# Altium footprint library IS12.01.02.PcbLib: 38 footprints (part 2 of 3)
Each footprint in its own frame and in the unit in brackets; x right, y up, seen from the top. Pads: shape width x height; smd on the part's side, far side on the other; paste and mask are expansions set on the pad; w line width, h text height; cw(c..) or ccw(c..) is an arc to the next point about the centre after c.
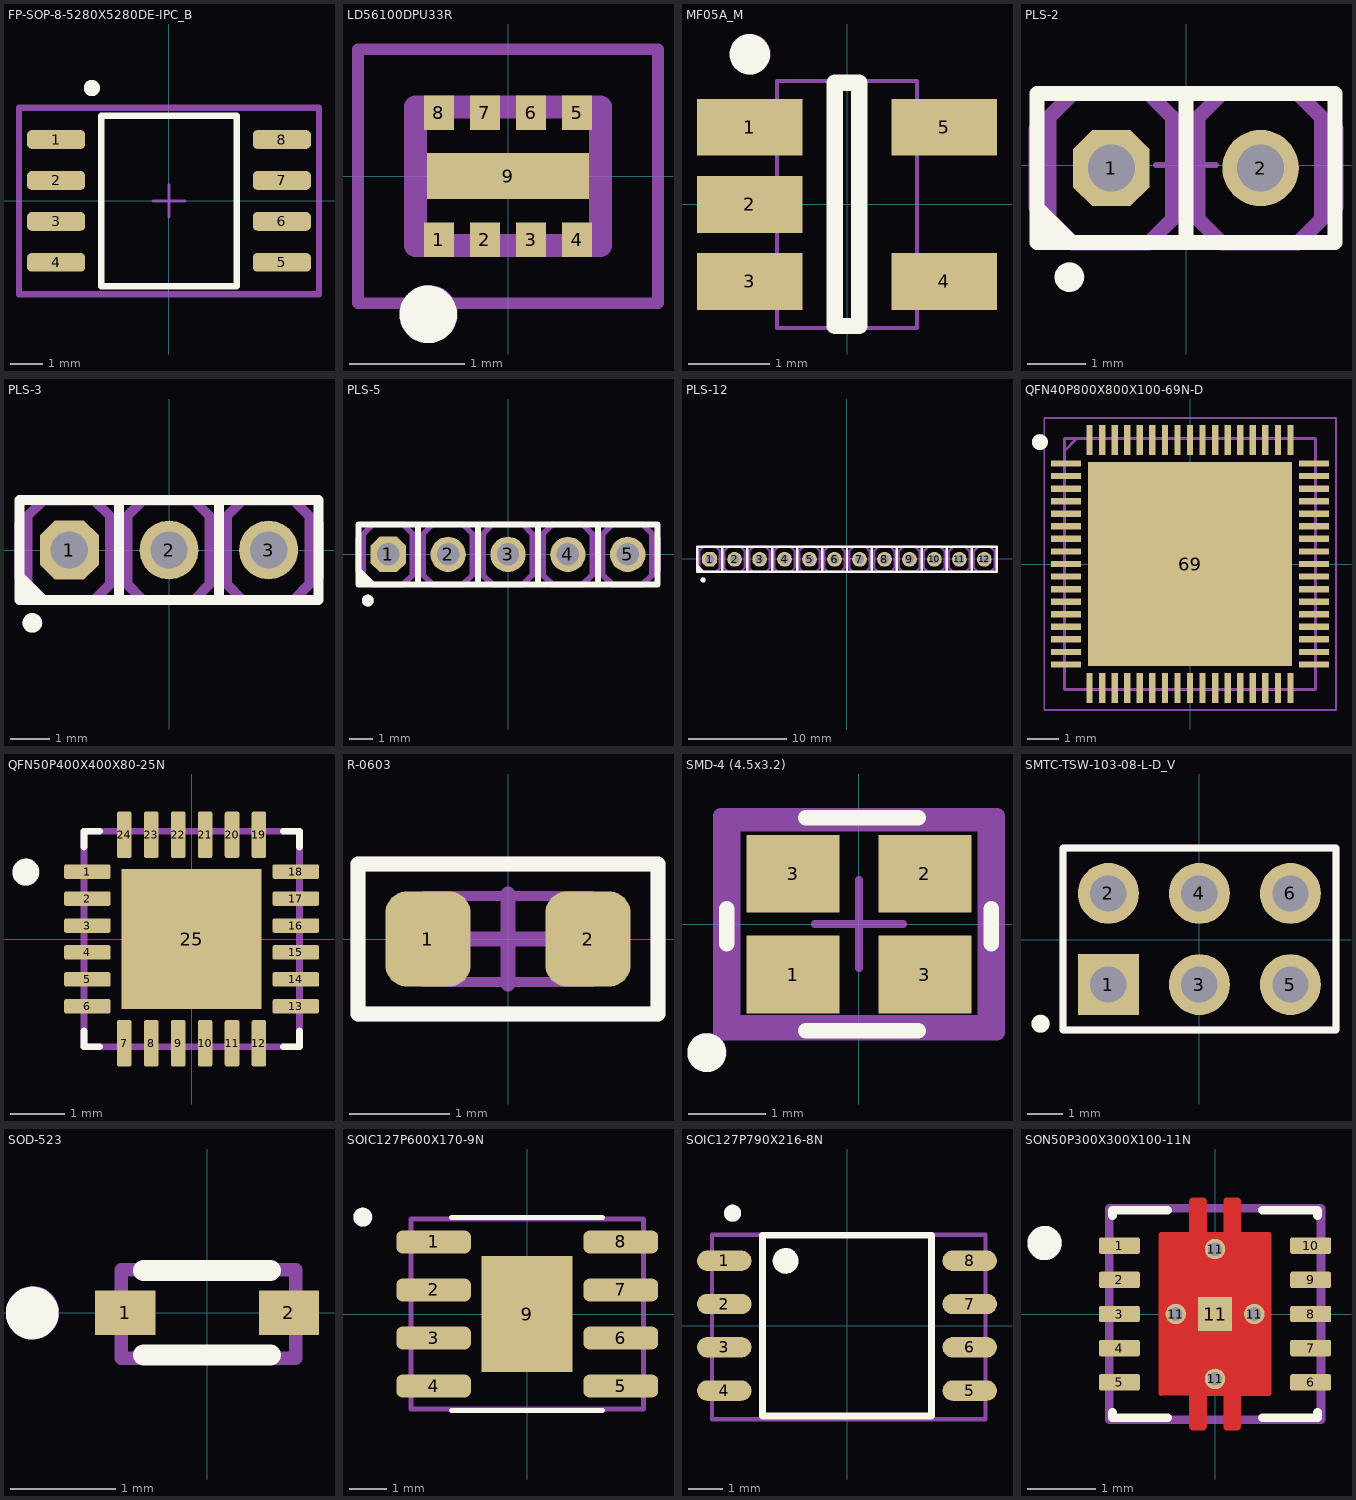
[diagram p1: the footprints below, top view; thin cyan lines are the x and y axes]

## FP-SOP-8-5280X5280DE-IPC_B [mm]
pads (8):
  rrect50% 1.805x0.582 smd paste+0 mask+0.051: 1(-3.501,1.905) 2(-3.501,0.635) 3(-3.501,-0.635) 4(-3.501,-1.905) 5(3.501,-1.905) 6(3.501,-0.635) 7(3.501,0.635) 8(3.501,1.905)
Top Overlay:
  circle w0.25: c-2.394,3.501 r0.125
  lines w0.2: -2.098,-2.64 -2.098,2.64 2.098,2.64 2.098,-2.64 -2.098,-2.64
Top Assembly:
  circle w0.25: c-2.388,3.505 r0.125
  lines w0.2: -4.653,-2.89 -4.653,2.89 4.653,2.89 4.653,-2.89 -4.653,-2.89
Top Courtyard:
  lines w0.2: -4.653,-2.89 -4.653,2.89 4.653,2.89 4.653,-2.89 -4.653,-2.89
Top Component Center:
  lines w0.1: -0.5,0 0.5,0 ; 0,-0.5 0,0.5
3D body "IC_ISSI_IS25LP064A-JBLE_eec.STEP": height 0.25, standoff 0, extent -4.653,-2.89 4.653,2.89

## LD56100DPU33R [mm]
pads (9):
  rect 0.26x0.3 smd: 1(-0.6,-0.55) 2(-0.2,-0.55) 3(0.2,-0.55) 4(0.6,-0.55) 5(0.6,0.55) 6(0.2,0.55) 7(-0.2,0.55) 8(-0.6,0.55)
  rect 1.4x0.4 smd: 9(0,0)
Top Overlay:
  circle w0.25: c-0.692,-1.198 r0.125
Top Assembly:
  circle w0.25: c-0.686,-1.194 r0.125
  lines w0.2: -0.8,-0.6 -0.8,0.6 0.8,0.6 0.8,-0.6 -0.8,-0.6
Mechanical 20:
  lines w0.1: -1.3,-1.1 1.3,-1.1 1.3,1.1 -1.3,1.1 -1.3,-1.1
3D body "LD56100DPU33R.stp": height 1.1, standoff 0, extent -0.8,-0.6 0.8,0.6

## MF05A_M [mm]
pads (5):
  rect 1.3x0.7 smd: 1(-1.2,0.95) 2(-1.2,0) 3(-1.2,-0.95) 4(1.2,-0.95) 5(1.2,0.95)
Top Overlay:
  circle w0.25: c-1.2,1.85 r0.125
  lines w0.2: -0.15,-1.5 -0.15,1.5 0.15,1.5 0.15,-1.5 -0.15,-1.5
Top Assembly:
  circle w0.25: c-1.194,1.854 r0.125
  lines w0.05: -0.864,-1.524 -0.864,1.524 0.864,1.524 0.864,-1.524 -0.864,-1.524
3D body: height 1.19, standoff 0.05, extent -0.835,-1.495 0.835,1.495

## PLS-2 [mm]
pads (2):
  oct 1.3x1.3 hole 0.8: 1(-1.27,-0.051)
  round 1.3 hole 0.8: 2(1.27,-0.051)
Top Overlay:
  circle w0.25: c-1.987,-1.909 r0.125
  region: -2.54,-0.551 -1.77,-1.321 -2.54,-1.321
  lines w0.254: 0,-1.301 0,1.199 ; 2.54,-1.321 -2.54,-1.321 -2.54,1.219 2.54,1.219 ; 2.54,-1.301 2.54,1.199
Top Assembly:
  circle w0.25: c-1.981,-1.905 r0.125
  lines w0.254: -2.334,-0.724 -2.554,-0.724 -2.554,0.616 -2.334,0.616 ; -0.234,-0.724 0.206,-0.724 ; -0.234,0.616 0.206,0.616 ; 2.334,-0.717 2.554,-0.717 2.554,0.623 2.334,0.623 ; -1.604,-0.374 -0.964,-0.374 ; -1.604,-0.374 -1.604,0.266 ; -1.604,-0.374 -1.404,-0.174 ; -1.604,0.266 -0.964,0.266 ; -1.604,0.266 -1.404,0.066 ; -1.404,-0.174 -1.164,-0.174 ; -1.404,-0.174 -1.404,0.066 ; -1.404,0.066 -1.164,0.066 ; -1.164,-0.174 -0.964,-0.374 ; -1.164,-0.174 -1.164,0.066 ; -1.164,0.066 -0.964,0.266 ; -0.964,-0.374 -0.964,0.266 ; 0.936,-0.374 0.936,0.266 ; 0.936,-0.374 1.136,-0.174 ; 0.936,-0.374 1.576,-0.374 ; 0.936,0.266 1.136,0.066 ; 0.936,0.266 1.576,0.266 ; 1.136,-0.174 1.376,-0.174 ; 1.136,-0.174 1.136,0.066 ; 1.136,0.066 1.376,0.066 ; 1.376,-0.174 1.576,-0.374 ; 1.376,-0.174 1.376,0.066 ; 1.376,0.066 1.576,0.266 ; 1.576,-0.374 1.576,0.266 ; -2.334,-0.924 -2.334,0.816 -1.934,1.216 -0.634,1.216 -0.234,0.816 -0.234,-0.924 -0.634,-1.324 -1.934,-1.324 -2.334,-0.924 ; 0.206,-0.924 0.206,0.816 0.606,1.216 1.906,1.216 2.306,0.816 2.306,-0.924 1.906,-1.324 0.606,-1.324 0.206,-0.924
Top Component Center:
  lines w0.1: -0.508,0 0.508,0 ; 0,-0.508 0,0.508
3D body "PLS-2.step": height 8.65, standoff -2.95, extent -2.54,-1.346 2.54,1.194

## PLS-3 [mm]
pads (3):
  oct 1.5x1.5 hole 0.95: 1(-2.54,0)
  round 1.5 hole 0.95: 2(0,0) 3(2.54,0)
Top Overlay:
  circle w0.25: c-3.486,-1.858 r0.125
  region: -3.81,-0.5 -3.04,-1.27 -3.81,-1.27
  lines w0.254: -1.27,-1.25 -1.27,1.25 ; 1.27,-1.25 1.27,1.25 ; 3.81,-1.27 -3.81,-1.27 -3.81,1.27 3.81,1.27 ; 3.81,-1.25 3.81,1.25
Top Assembly:
  circle w0.25: c-3.48,-1.854 r0.125
  lines w0.254: -3.604,-0.674 -3.824,-0.674 -3.824,0.666 -3.604,0.666 ; -1.504,-0.674 -1.064,-0.674 ; -1.504,0.666 -1.064,0.666 ; 1.036,-0.674 1.476,-0.674 ; 1.036,0.666 1.476,0.666 ; 3.604,-0.666 3.824,-0.666 3.824,0.674 3.604,0.674 ; -2.874,-0.324 -2.674,-0.124 ; -2.874,-0.324 -2.874,0.316 ; -2.874,-0.324 -2.234,-0.324 ; -2.874,0.316 -2.674,0.116 ; -2.874,0.316 -2.234,0.316 ; -2.674,-0.124 -2.674,0.116 ; -2.674,-0.124 -2.434,-0.124 ; -2.674,0.116 -2.434,0.116 ; -2.434,-0.124 -2.434,0.116 ; -2.434,-0.124 -2.234,-0.324 ; -2.434,0.116 -2.234,0.316 ; -2.234,-0.324 -2.234,0.316 ; -0.334,-0.324 0.306,-0.324 ; -0.334,-0.324 -0.134,-0.124 ; -0.334,-0.324 -0.334,0.316 ; -0.334,0.316 0.306,0.316 ; -0.334,0.316 -0.134,0.116 ; -0.134,-0.124 -0.134,0.116 ; -0.134,-0.124 0.106,-0.124 ; -0.134,0.116 0.106,0.116 ; 0.106,-0.124 0.106,0.116 ; 0.106,-0.124 0.306,-0.324 ; 0.106,0.116 0.306,0.316 ; 0.306,-0.324 0.306,0.316 ; 2.206,-0.324 2.406,-0.124 ; 2.206,-0.324 2.206,0.316 ; 2.206,-0.324 2.846,-0.324 ; 2.206,0.316 2.846,0.316 ; 2.206,0.316 2.406,0.116 ; 2.406,-0.124 2.406,0.116 ; 2.406,-0.124 2.646,-0.124 ; 2.406,0.116 2.646,0.116 ; 2.646,-0.124 2.646,0.116 ; 2.646,-0.124 2.846,-0.324 ; 2.646,0.116 2.846,0.316 ; 2.846,-0.324 2.846,0.316 ; -3.604,-0.874 -3.204,-1.274 -1.904,-1.274 -1.504,-0.874 -1.504,0.866 -1.904,1.266 -3.204,1.266 -3.604,0.866 -3.604,-0.874 ; -1.064,-0.874 -0.664,-1.274 0.636,-1.274 1.036,-0.874 1.036,0.866 0.636,1.266 -0.664,1.266 -1.064,0.866 -1.064,-0.874 ; 1.476,-0.874 1.876,-1.274 3.176,-1.274 3.576,-0.874 3.576,0.866 3.176,1.266 1.876,1.266 1.476,0.866 1.476,-0.874
Top Component Center:
  lines w0.1: -0.508,0 0.508,0 ; 0,-0.508 0,0.508
3D body "PLS-3.step": height 8.65, standoff -2.95, extent -3.81,-1.27 3.81,1.27

## PLS-5 [mm]
pads (5):
  oct 1.5x1.5 hole 0.95: 1(-5.08,0)
  round 1.5 hole 0.95: 2(-2.54,0) 3(0,0) 4(2.54,0) 5(5.08,0)
Top Overlay:
  circle w0.25: c-5.95,-1.96 r0.125
  region: -6.35,-0.5 -5.58,-1.27 -6.35,-1.27
  lines w0.254: -3.81,-1.25 -3.81,1.25 ; -1.27,-1.25 -1.27,1.25 ; 1.27,-1.25 1.27,1.25 ; 3.81,-1.25 3.81,1.25 ; 6.35,-1.27 -6.35,-1.27 -6.35,1.27 6.35,1.27 ; 6.35,-1.25 6.35,1.25
Top Assembly:
  circle w0.25: c-5.944,-1.956 r0.125
  lines w0.254: -6.144,-0.674 -6.364,-0.674 -6.364,0.666 -6.144,0.666 ; -4.044,-0.674 -3.604,-0.674 ; -4.044,0.666 -3.604,0.666 ; -1.504,-0.674 -1.064,-0.674 ; -1.504,0.666 -1.064,0.666 ; 1.036,-0.674 1.476,-0.674 ; 1.036,0.666 1.476,0.666 ; 3.576,-0.674 4.016,-0.674 ; 3.576,0.666 4.016,0.666 ; 6.144,-0.666 6.364,-0.666 6.364,0.674 6.144,0.674 ; -5.414,-0.324 -4.774,-0.324 ; -5.414,-0.324 -5.414,0.316 ; -5.414,-0.324 -5.214,-0.124 ; -5.414,0.316 -4.774,0.316 ; -5.414,0.316 -5.214,0.116 ; -5.214,-0.124 -4.974,-0.124 ; -5.214,-0.124 -5.214,0.116 ; -5.214,0.116 -4.974,0.116 ; -4.974,-0.124 -4.774,-0.324 ; -4.974,-0.124 -4.974,0.116 ; -4.974,0.116 -4.774,0.316 ; -4.774,-0.324 -4.774,0.316 ; -2.874,-0.324 -2.874,0.316 ; -2.874,-0.324 -2.674,-0.124 ; -2.874,-0.324 -2.234,-0.324 ; -2.874,0.316 -2.674,0.116 ; -2.874,0.316 -2.234,0.316 ; -2.674,-0.124 -2.434,-0.124 ; -2.674,-0.124 -2.674,0.116 ; -2.674,0.116 -2.434,0.116 ; -2.434,-0.124 -2.234,-0.324 ; -2.434,-0.124 -2.434,0.116 ; -2.434,0.116 -2.234,0.316 ; -2.234,-0.324 -2.234,0.316 ; -0.334,-0.324 0.306,-0.324 ; -0.334,-0.324 -0.334,0.316 ; -0.334,-0.324 -0.134,-0.124 ; -0.334,0.316 -0.134,0.116 ; -0.334,0.316 0.306,0.316 ; -0.134,-0.124 0.106,-0.124 ; -0.134,-0.124 -0.134,0.116 ; -0.134,0.116 0.106,0.116 ; 0.106,-0.124 0.306,-0.324 ; 0.106,-0.124 0.106,0.116 ; 0.106,0.116 0.306,0.316 ; 0.306,-0.324 0.306,0.316 ; 2.206,-0.324 2.846,-0.324 ; 2.206,-0.324 2.206,0.316 ; 2.206,-0.324 2.406,-0.124 ; 2.206,0.316 2.846,0.316 ; 2.206,0.316 2.406,0.116 ; 2.406,-0.124 2.646,-0.124 ; 2.406,-0.124 2.406,0.116 ; 2.406,0.116 2.646,0.116 ; 2.646,-0.124 2.846,-0.324 ; 2.646,-0.124 2.646,0.116 ; 2.646,0.116 2.846,0.316 ; 2.846,-0.324 2.846,0.316 ; 4.746,-0.324 5.386,-0.324 ; 4.746,-0.324 4.746,0.316 ; 4.746,-0.324 4.946,-0.124 ; 4.746,0.316 5.386,0.316 ; 4.746,0.316 4.946,0.116 ; 4.946,-0.124 5.186,-0.124 ; 4.946,-0.124 4.946,0.116 ; 4.946,0.116 5.186,0.116 ; 5.186,-0.124 5.186,0.116 ; 5.186,-0.124 5.386,-0.324 ; 5.186,0.116 5.386,0.316 ; 5.386,-0.324 5.386,0.316 ; -6.144,-0.874 -6.144,0.866 -5.744,1.266 -4.444,1.266 -4.044,0.866 -4.044,-0.874 -4.444,-1.274 -5.744,-1.274 -6.144,-0.874 ; -3.604,-0.874 -3.604,0.866 -3.204,1.266 -1.904,1.266 -1.504,0.866 -1.504,-0.874 -1.904,-1.274 -3.204,-1.274 -3.604,-0.874 ; -1.064,-0.874 -1.064,0.866 -0.664,1.266 0.636,1.266 1.036,0.866 1.036,-0.874 0.636,-1.274 -0.664,-1.274 -1.064,-0.874 ; 1.476,-0.874 1.476,0.866 1.876,1.266 3.176,1.266 3.576,0.866 3.576,-0.874 3.176,-1.274 1.876,-1.274 1.476,-0.874 ; 4.016,-0.874 4.016,0.866 4.416,1.266 5.716,1.266 6.116,0.866 6.116,-0.874 5.716,-1.274 4.416,-1.274 4.016,-0.874
Top Component Center:
  lines w0.1: -0.508,0 0.508,0 ; 0,-0.508 0,0.508
3D body "PLS-5.step": height 8.65, standoff -2.95, extent -6.35,-1.27 6.35,1.27

## PLS-12 [mm]
pads (12):
  oct 1.5x1.5 hole 0.95: 1(-13.945,-0.051)
  round 1.5 hole 0.95: 2(-11.405,-0.051) 3(-8.865,-0.051) 4(-6.325,-0.051) 5(-3.785,-0.051) 6(-1.245,-0.051) 7(1.295,-0.051) 8(3.835,-0.051) 9(6.375,-0.051) 10(8.915,-0.051) 11(11.455,-0.051) 12(13.995,-0.051)
Top Overlay:
  circle w0.25: c-14.611,-2.138 r0.125
  region: -15.215,-0.551 -14.445,-1.321 -15.215,-1.321
  lines w0.254: -12.675,-1.301 -12.675,1.199 ; -10.135,-1.301 -10.135,1.199 ; -7.595,-1.301 -7.595,1.199 ; -5.055,-1.301 -5.055,1.199 ; -2.515,-1.301 -2.515,1.199 ; 0.025,-1.301 0.025,1.199 ; 2.565,-1.301 2.565,1.199 ; 5.105,-1.301 5.105,1.199 ; 7.645,-1.301 7.645,1.199 ; 10.185,-1.301 10.185,1.199 ; 12.725,-1.301 12.725,1.199 ; 15.265,-1.321 -15.215,-1.321 -15.215,1.219 15.265,1.219 ; 15.265,-1.301 15.265,1.199
Top Assembly:
  drawing of 271 lines, arcs and shapes, not listed
Top Component Center:
  lines w0.1: -0.508,0 0.508,0 ; 0,-0.508 0,0.508
3D body "PLS-12.stp": height 8.6, standoff -3, extent -15.215,-1.321 15.265,1.219

## QFN40P800X800X100-69N-D [mm]
pads (69):
  rect 0.95x0.2 smd: 1(-3.95,3.2) 2(-3.95,2.8) 3(-3.95,2.4) 4(-3.95,2) 5(-3.95,1.6) 6(-3.95,1.2) 7(-3.95,0.8) 8(-3.95,0.4) 9(-3.95,0) 10(-3.95,-0.4) 11(-3.95,-0.8) 12(-3.95,-1.2) 13(-3.95,-1.6) 14(-3.95,-2) 15(-3.95,-2.4) 16(-3.95,-2.8) 17(-3.95,-3.2) 35(3.95,-3.2) 36(3.95,-2.8) 37(3.95,-2.4) 38(3.95,-2) 39(3.95,-1.6) 40(3.95,-1.2) 41(3.95,-0.8) 42(3.95,-0.4) 43(3.95,0) 44(3.95,0.4) 45(3.95,0.8) 46(3.95,1.2) 47(3.95,1.6) 48(3.95,2) 49(3.95,2.4) 50(3.95,2.8) 51(3.95,3.2)
  rect 0.2x0.95 smd: 18(-3.2,-3.95) 19(-2.8,-3.95) 20(-2.4,-3.95) 21(-2,-3.95) 22(-1.6,-3.95) 23(-1.2,-3.95) 24(-0.8,-3.95) 25(-0.4,-3.95) 26(0,-3.95) 27(0.4,-3.95) 28(0.8,-3.95) 29(1.2,-3.95) 30(1.6,-3.95) 31(2,-3.95) 32(2.4,-3.95) 33(2.8,-3.95) 34(3.2,-3.95) 52(3.2,3.95) 53(2.8,3.95) 54(2.4,3.95) 55(2,3.95) 56(1.6,3.95) 57(1.2,3.95) 58(0.8,3.95) 59(0.4,3.95) 60(0,3.95) 61(-0.4,3.95) 62(-0.8,3.95) 63(-1.2,3.95) 64(-1.6,3.95) 65(-2,3.95) 66(-2.4,3.95) 67(-2.8,3.95) 68(-3.2,3.95)
  rect 6.5x6.5 smd: 69(0,0)
Top Overlay:
  circle w0.25: c-4.781,3.882 r0.125
Top Assembly:
  circle w0.25: c-4.775,3.886 r0.125
  lines w0.1: -4,3.6 -3.6,4 ; -4,-4 4,-4 4,4 -4,4 -4,-4
Mechanical 20:
  lines w0.05: -4.65,-4.65 4.65,-4.65 4.65,4.65 -4.65,4.65 -4.65,-4.65
3D body "STM32WB55RCV6.stp": height 1, standoff 0, extent -4.05,-4.05 4.05,4.05

## QFN50P400X400X80-25N [mm]
pads (25):
  rrect25% 0.86x0.27 smd: 1(-1.935,1.25) 2(-1.935,0.75) 3(-1.935,0.25) 4(-1.935,-0.25) 5(-1.935,-0.75) 6(-1.935,-1.25) 13(1.935,-1.25) 14(1.935,-0.75) 15(1.935,-0.25) 16(1.935,0.25) 17(1.935,0.75) 18(1.935,1.25)
  rrect25% 0.27x0.86 smd: 7(-1.25,-1.935) 8(-0.75,-1.935) 9(-0.25,-1.935) 10(0.25,-1.935) 11(0.75,-1.935) 12(1.25,-1.935) 19(1.25,1.935) 20(0.75,1.935) 21(0.25,1.935) 22(-0.25,1.935) 23(-0.75,1.935) 24(-1.25,1.935)
  rect 2.6x2.6 smd paste-2: 25(0,0)
Top Overlay:
  circle w0.25: c-3.08,1.24 r0.125
  lines w0.127: -2,-1.705 -2,-2 -1.705,-2 ; -2,1.705 -2,2 -1.705,2 ; 1.705,-2 2,-2 2,-1.705 ; 1.705,2 2,2 2,1.705
Top Paste:
  region: 0.82,-0.82 -0.82,-0.82 -0.82,0.82 0.82,0.82
Top Assembly:
  circle w0.25: c-3.073,1.245 r0.125
  lines w0.127: -2,-2 -2,2 2,2 2,-2 -2,-2
3D body "BQ25895MRTWR.step": height 0.8, standoff 0, extent -2,-2 2,2

## R-0603 [mm]
pads (2):
  rrect50% 0.85x0.95 smd: 1(-0.8,0) 2(0.8,0)
Top Overlay:
  lines w0.15: -1.5,-0.75 0,-0.75 1.5,-0.75 1.5,0.75 0,0.75 -1.5,0.75 -1.5,-0.75
Top Assembly:
  lines w0.1: -0.838,-0.432 0.838,-0.432 0.838,0.432 -0.838,0.432 -0.838,-0.432
Top Component Outline:
  lines w0.15: -0.45,0 0.45,0 ; 0,-0.45 0,0.45 ; -1.5,-0.75 1.5,-0.75 1.5,0.75 -1.5,0.75 -1.5,-0.75
3D body "SMD R-0603.STEP": height 0.45, standoff -0.01, extent -0.8,-0.4 0.8,0.4

## SMD-4 (4.5x3.2) [mm]
pads (4):
  rect 1.2x1 smd paste+0 mask+0.051: 1(-0.85,-0.648) 2(0.85,0.652) 3(-0.85,0.652) 3(0.85,-0.648)
Top Overlay:
  circle w0.25: c-1.962,-1.655 r0.125
  lines w0.2: -1.702,-0.252 -1.702,0.198 ; -0.686,-1.37 0.764,-1.37 ; -0.686,1.373 0.764,1.373 ; 1.702,-0.252 1.702,0.198
Top Assembly:
  circle w0.25: c-1.956,-1.651 r0.125
  lines w0.2: -1.626,-1.268 1.626,-1.268 1.626,1.297 -1.626,1.297 -1.626,-1.268
Top Courtyard:
  lines w0.2: -1.778,-1.395 1.778,-1.395 1.778,1.399 -1.778,1.399 -1.778,-1.395
Top Component Center:
  lines w0.1: -0.57,0.002 0.57,0.002 ; 0,-0.568 0,0.572
3D body "OSC3225.STEP": height 1, standoff 0, extent -1.6,-1.263 1.6,1.266

## SMTC-TSW-103-08-L-D_V [mil]
pads (6):
  rect 67x67 / inner round 67 / far side rect 67x67 hole 40 mask+2: 1(-99.64,-49.08)
  round 67 hole 40 mask+2: 2(-99.64,50.92) 3(0.36,-49.08) 4(0.36,50.92) 5(100.36,-49.08) 6(100.36,50.92)
Top Overlay:
  circle w9.84: c-174.24,-92.17 r4.92
  lines w7.87: -149.64,-99.08 150.36,-99.08 150.36,100.92 -149.64,100.92 -149.64,-99.08
Top Assembly:
  circle w9.84: c-174,-92 r4.92
  lines w7.87: -149.64,-99.08 150.36,-99.08 150.36,100.92 -149.64,100.92 -149.64,-99.08
3D body "PLS-2.step": height 340.55, standoff -116.14, extent -49.65,-99.08 50.35,100.92
3D body "PLS-2.step": height 340.55, standoff -116.14, extent -149.65,-99.08 -49.65,100.92
3D body "PLS-2.step": height 340.55, standoff -116.14, extent 50.36,-99.08 150.36,100.92

## SOD-523 [mm]
pads (2):
  rect 0.57x0.42 smd: 1(-0.775,0) 2(0.775,0)
Top Overlay:
  circle w0.25: c-1.657,-0.004 r0.125
  lines w0.2: -0.6,-0.4 0.6,-0.4 ; -0.6,0.4 0.6,0.4
Top Assembly:
  circle w0.25: c-1.651,0 r0.125
  lines w0.127: -0.813,-0.432 0.838,-0.432 0.838,0.406 -0.813,0.406 -0.813,-0.432
3D body "step_temp.STEP": height 0.65, standoff 0, extent -0.8,-0.4 0.8,0.4

## SOIC127P600X170-9N [mm]
pads (9):
  rrect50% 1.97x0.6 smd: 1(-2.475,1.905) 2(-2.475,0.635) 3(-2.475,-0.635) 4(-2.475,-1.905) 5(2.475,-1.905) 6(2.475,-0.635) 7(2.475,0.635) 8(2.475,1.905)
  rect 2.41x3.076 smd paste-3: 9(0,0)
Top Overlay:
  circle w0.25: c-4.35,2.561 r0.125
  lines w0.127: -2,-2.55 2,-2.55 ; -2,2.55 2,2.55
Top Paste:
  region: 0.851,-1.08 -0.851,-1.08 -0.851,1.08 0.851,1.08
Top Assembly:
  circle w0.25: c-4.343,2.565 r0.125
  lines w0.127: -3.073,-2.515 3.073,-2.515 3.073,2.515 -3.073,2.515 -3.073,-2.515
3D body "step_temp.STEP": height 1.7, standoff 0, extent -3,-2.45 3,2.45

## SOIC127P790X216-8N [mm]
pads (8):
  oval 1.6x0.6 smd: 1(-3.6,1.905) 2(-3.6,0.635) 3(-3.6,-0.635) 4(-3.6,-1.905) 5(3.6,-1.905) 6(3.6,-0.635) 7(3.6,0.635) 8(3.6,1.905)
Top Overlay:
  circle w0.127: c-1.8,1.9 r0.316
  circle w0.127: c-1.8,1.9 r0.224
  circle w0.127: c-1.8,1.9 r0.141
  circle w0.127: c-1.8,1.9 r0.1
  circle w0.127: c-1.8,1.8 r0.1
  circle w0.25: c-3.359,3.298 r0.125
  lines w0.2: -2.475,-2.65 2.475,-2.65 2.475,2.65 -2.475,2.65 -2.475,-2.65
Top Assembly:
  circle w0.25: c-3.353,3.302 r0.125
  lines w0.127: -3.962,-2.743 4.064,-2.743 4.064,2.667 -3.962,2.667 -3.962,-2.743
3D body "W25Q32BVSSIG.step": height 2.16, standoff 0, extent -3.889,-2.666 4.011,2.614

## SON50P300X300X100-11N [mm]
pads (15):
  rrect25% 0.6x0.24 smd mask+0: 1(-1.4,1) 2(-1.4,0.5) 3(-1.4,0) 4(-1.4,-0.5) 5(-1.4,-1) 6(1.4,-1) 7(1.4,-0.5) 8(1.4,0) 9(1.4,0.5) 10(1.4,1)
  round 0.3 hole 0.2 mask+0: 11(-0.575,0) 11(0,-0.95) 11(0,0.95) 11(0.575,0)
  rrect5% 0.5x0.5 smd paste-1 mask+0: 11(0,0)
Top Layer:
  region: 356 vertices and 0 holes, not listed, extent -0.825,-1.7 0.825,1.7
Top Overlay:
  circle w0.25: c-2.495,1.037 r0.125
  lines w0.127: -1.5,-1.44 -1.5,-1.52 -0.695,-1.52 ; -1.5,1.44 -1.5,1.52 -0.695,1.52 ; 0.695,-1.52 1.5,-1.52 1.5,-1.44 ; 0.695,1.52 1.5,1.52 1.5,1.44
Top Paste:
  drawing of 6 lines, arcs and shapes, not listed
Top Solder:
  drawing of 11 lines, arcs and shapes, not listed
Top Assembly:
  circle w0.25: c-2.489,1.041 r0.125
  lines w0.127: -1.549,-1.549 1.549,-1.549 1.549,1.549 -1.549,1.549 -1.549,-1.549
3D body "step_temp.STEP": height 1, standoff 0, extent -1.5,-1.5 1.5,1.5